# Altium footprint library ICL_connectors_v1.PcbLib: 86 footprints (part 2 of 6)
Each footprint in its own frame and in the unit in brackets; x right, y up, seen from the top. Pads: shape width x height; smd on the part's side, far side on the other; paste and mask are expansions set on the pad; w line width, h text height; cw(c..) or ccw(c..) is an arc to the next point about the centre after c.
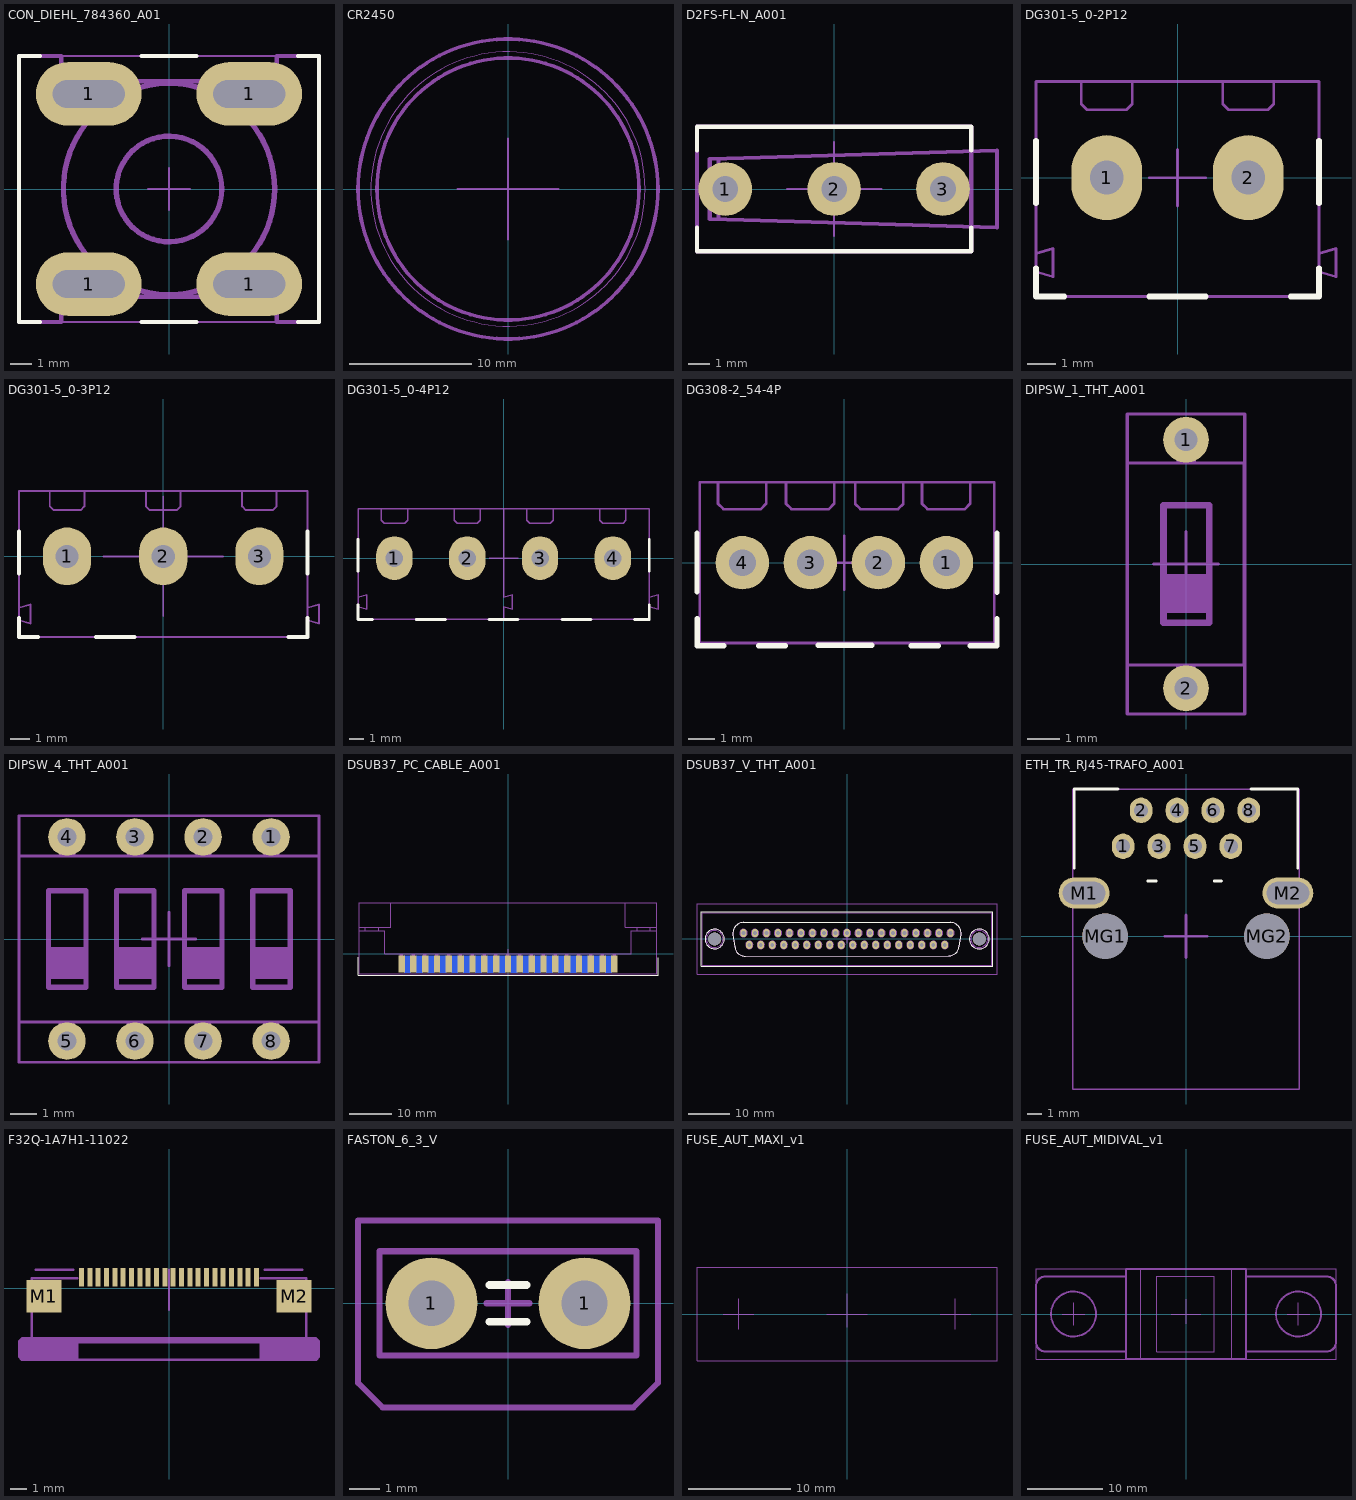
[diagram p1: the footprints below, top view; thin cyan lines are the x and y axes]

## CON_DIEHL_784360_A01 [mm] "Screw Mounting Bracket"
pads (4):
  oval 5x3 hole 1.3 slot 3.4 at 0 deg paste-1: 1(-3.8,-4.5) 1(-3.8,4.5) 1(3.8,-4.5) 1(3.8,4.5)
Top Overlay:
  lines w0.2: -6.1,-6.3 -7.1,-6.3 -7.1,6.3 -6.1,6.3 ; -1.3,-6.3 1.3,-6.3 ; -1.3,6.3 1.3,6.3 ; 6.1,-6.3 7.1,-6.3 7.1,6.3 6.1,6.3
Top M15-16_SORG:
  lines w0.1: -1,0 0,0 ; 0,-1 0,0 ; 0,1 0,0 ; 1,0 0,0 ; -7.1,-6.3 7.1,-6.3 7.1,6.3 -7.1,6.3 -7.1,-6.3
Top M17-18_TDES:
  text "'.Designator'" at -6.798,0.5 h1.2
Top M19-20_TMOT:
  circle w0.254: c0,0 r2.5
  circle w0.254: c0,0 r5
  lines w0.2: -7.1,-6.3 -7.1,6.3 -5.1,6.3 -5.1,5.1 ccw(c-4.05,5.1) -3,5.1 3,5.1 ccw(c4.05,5.1) 5.1,5.1 5.1,6.3 7.1,6.3 7.1,-6.3 5.1,-6.3 5.1,-5.1 ccw(c4.05,-5.1) 3,-5.1 -3,-5.1 ccw(c-4.05,-5.1) -5.1,-5.1 -5.1,-6.3 -7.1,-6.3
3D body "784360swp001.stp": height 16.9, standoff -3.7, extent -7.1,-6.3 7.1,6.3

## CR2450 [mm] "battery CR2450"
Top M15-16_SORG:
  lines w0.2: -4.1,0 0,0 ; 0,-4.1 0,0 ; 0,4.1 0,0 ; 4.1,0 0,0
Top M17-18_TDES:
  text "'.Designator'" at -10.297,5.15 h1.8
Top M19-20_TMOT:
  circle w0.1: c0,0 r11.2
  circle w0.3: c0,0 r12.25
  circle w0.3: c0,0 r10.7
3D body "CR_2450_panasonic.step": height 4.76, standoff 0.01, extent -12.25,-12.25 12.25,12.25

## D2FS-FL-N_A001 [mm] "omron D2FS-FL-Nxx"
pads (3):
  round 2.5 hole 1.2: 1(-5.08,0) 2(0,0) 3(5.08,0)
Top Overlay:
  lines w0.2: -6.4,-1.8 -6.4,-2.9 6.4,-2.9 6.4,-1.8 ; -6.4,1.8 -6.4,2.9 6.4,2.9 6.4,1.8
Top M15-16_SORG:
  lines w0.1: -2.2,0 0,0 ; 0,-2.2 0,0 ; 0,2.2 0,0 ; 2.2,0 0,0 ; 6.4,-1.8 7.6,-1.8 7.6,1.8 6.4,1.8 ; -6.4,-2.9 -6.4,2.9 6.4,2.9 6.4,-2.9 -6.4,-2.9
Top M17-18_TDES:
  text "'.Designator'" at -6.898,3.8 h1.2
Top M19-20_TMOT:
  lines w0.2: -6.4,1.8 -6.4,-2.9 ; -5.4,-1.4 -5.4,1.4 ; -6.4,-2.9 6.4,-2.9 6.4,2.9 -6.4,2.9 -6.4,-2.9 ; -5.8,-1.4 7.6,-1.8 7.6,1.8 -5.8,1.4 -5.8,-1.4
3D body "D2FS_FL_N.STEP": height 8.3, standoff -3.49, extent -6.4,-2.9 7.57,2.9

## DG301-5_0-2P12 [mm]
pads (2):
  oval 2.5x3 hole 1.2 paste-1: 1(-2.5,0) 2(2.5,0)
Top Overlay:
  lines w0.2: -5,-3.2 -5,-4.2 -4,-4.2 ; -5,-0.9 -5,1.3 ; -1,-4.2 0,-4.2 1,-4.2 ; 4,-4.2 5,-4.2 5,-3.2 ; 5,-0.9 5,1.3
Top M15-16_SORG:
  lines w0.1: -1,0 0,0 ; 0,-1 0,0 ; 0,1 0,0 ; 1,0 0,0 ; -5,-4.2 5,-4.2 5,3.4 -5,3.4 -5,-4.2
Top M17-18_TDES:
  text "'.Designator'" at -6.798,-3 h1.2
Top M19-20_TMOT:
  lines w0.1: -3.4,3.4 -3.4,2.6 -3.2,2.4 -1.8,2.4 -1.6,2.6 -1.6,3.4 ; 1.6,3.4 1.6,2.6 1.8,2.4 3.2,2.4 3.4,2.6 3.4,3.4 ; -5,-4.2 5,-4.2 5,-3.325 5.6,-3.5 5.6,-2.5 5,-2.675 5,3.4 -5,3.4 -5,-2.675 -4.4,-2.5 -4.4,-3.5 -5,-3.325 -5,-4.2
3D body "DG301-5_0-2P12.STEP": height 10, standoff -4.16, extent -5,-4.2 5.6,3.4

## DG301-5_0-3P12 [mm]
pads (3):
  oval 2.5x3 hole 1.2 paste-1: 1(-5,0) 2(0,0) 3(5,0)
Top Overlay:
  lines w0.2: -7.5,-3.2 -7.5,-4.2 -6.5,-4.2 ; -7.5,-0.9 -7.5,1.3 ; -3.5,-4.2 -2.5,-4.2 -1.5,-4.2 ; 6.5,-4.2 7.5,-4.2 7.5,-3.2 ; 7.5,-0.9 7.5,1.3
Top M15-16_SORG:
  lines w0.1: -3.1,0 0,0 ; 0,-3.1 0,0 ; 0,3.1 0,0 ; 3.1,0 0,0 ; -7.5,-4.2 -7.5,3.4 7.5,3.4 7.5,-4.2 -7.5,-4.2
Top M17-18_TDES:
  text "'.Designator'" at -6.798,-3.2 h1.2
Top M19-20_TMOT:
  lines w0.1: -5.9,3.4 -5.9,2.6 -5.7,2.4 -4.3,2.4 -4.1,2.6 -4.1,3.4 ; -0.9,3.4 -0.9,2.6 -0.7,2.4 0.7,2.4 0.9,2.6 0.9,3.4 ; 4.1,3.4 4.1,2.6 4.3,2.4 5.7,2.4 5.9,2.6 5.9,3.4 ; -7.5,-4.2 -7.5,-3.325 -6.9,-3.5 -6.9,-2.5 -7.5,-2.675 -7.5,3.4 7.5,3.4 7.5,-2.675 8.1,-2.5 8.1,-3.5 7.5,-3.325 7.5,-4.2 -7.5,-4.2
3D body "DG301-5_0-3P12.STEP": height 10.01, standoff -4.15, extent -7.5,-4.2 8.1,3.4

## DG301-5_0-4P12 [mm]
pads (4):
  oval 2.5x3 hole 1.2 paste-1: 1(-7.5,0) 2(-2.5,0) 3(2.5,0) 4(7.5,0)
Top Overlay:
  lines w0.2: -10,-3.2 -10,-4.2 -9,-4.2 ; -10,-0.9 -10,1.3 ; -6,-4.2 -5,-4.2 -4,-4.2 ; -1,-4.2 0,-4.2 1,-4.2 ; 4,-4.2 5,-4.2 6,-4.2 ; 9,-4.2 10,-4.2 10,-3.2 ; 10,-0.9 10,1.3
Top M15-16_SORG:
  lines w0.1: -1,0 0,0 ; 0,-1 0,0 ; 0,1 0,0 ; 1,0 0,0 ; -10,-4.2 -10,3.4 10,3.4 10,-4.2 -10,-4.2
Top M17-18_TDES:
  text "'.Designator'" at -6.798,-3 h1.2
Top M19-20_TMOT:
  lines w0.1: -8.4,3.4 -8.4,2.6 -8.2,2.4 -6.8,2.4 -6.6,2.6 -6.6,3.4 ; -3.4,3.4 -3.4,2.6 -3.2,2.4 -1.8,2.4 -1.6,2.6 -1.6,3.4 ; 1.6,3.4 1.6,2.6 1.8,2.4 3.2,2.4 3.4,2.6 3.4,3.4 ; 6.6,3.4 6.6,2.6 6.8,2.4 8.2,2.4 8.4,2.6 8.4,3.4 ; 0,-4.2 -10,-4.2 -10,-3.325 -9.4,-3.5 -9.4,-2.5 -10,-2.675 -10,3.4 0,3.4 ; 0,-4.2 0,-3.325 0.6,-3.5 0.6,-2.5 0,-2.675 0,3.4 ; 0,-4.2 10,-4.2 10,-3.325 10.6,-3.5 10.6,-2.5 10,-2.675 10,3.4 0,3.4
3D body "DG301-5_0-2P12.STEP": height 10, standoff -4.16, extent 0,-4.2 10.6,3.4
3D body "DG301-5_0-2P12.STEP": height 10, standoff -4.16, extent -10,-4.2 0.6,3.4

## DG308-2_54-4P [mm]
pads (4):
  round 2 hole 1 paste-1: 1(3.81,0) 2(1.27,0) 3(-1.27,0) 4(-3.81,0)
Top Overlay:
  lines w0.2: -5.504,-1.091 -5.504,1.109 ; -5.5,-2.1 -5.5,-3.1 -4.5,-3.1 ; -3.2,-3.1 -2.2,-3.1 ; -0.982,-3.08 0.018,-3.08 ; 0.018,-3.08 1.018,-3.08 ; 2.5,-3.1 3.5,-3.1 ; 4.7,-3.1 5.7,-3.1 5.7,-2.1 ; 5.7,-1.1 5.7,1.1
Top M15-16_SORG:
  lines w0.1: -1,0 0,0 ; 0,-1 0,0 ; 0,1 0,0 ; 1,0 0,0 ; -5.4,-3 5.6,-3 5.6,3 -5.4,3 -5.4,-3
Top M17-18_TDES:
  text "'.Designator'" at -6.798,-2.7 h1.2
Top M19-20_TMOT:
  lines w0.1: -4.72,3 -4.72,2.2 -4.52,2 -3.12,2 -2.92,2.2 -2.92,3 ; -2.18,3 -2.18,2.2 -1.98,2 -0.58,2 -0.38,2.2 -0.38,3 ; 2.2,3 2.2,2.2 2,2 0.6,2 0.4,2.2 0.4,3 ; 2.9,3 2.9,2.2 3.1,2 4.5,2 4.7,2.2 4.7,3 ; 0.4,3 5.6,3 5.6,-3 -5.4,-3 -5.4,3 0.4,3
3D body "DG308-4.step": height 7.84, standoff -3.99, extent -5.43,-3.022 5.57,3

## DIPSW_1_THT_A001 [mm]
pads (2):
  round 1.4 hole 0.7 mask+0: 1(0,3.81) 2(0,-3.81)
Top M15-16_SORG:
  lines w0.1: -1,0 0,0 ; 0,-1 0,0 ; 0,1 0,0 ; 1,0 0,0 ; -1.8,-4.6 -1.8,4.6 1.8,4.6 1.8,-4.6 -1.8,-4.6
Top M17-18_TDES:
  text "'.Designator'" at -6.598,5.2 h1.2
Top M19-20_TMOT:
  rectangle: -0.69,-1.5 0.71,-0.3
  region: 0.29,-3.1 -0.31,-3.1 -0.31,-4 0.29,-4
  rectangle: -0.29,3.1 0.31,4
  lines w0.1: -1.8,-3.1 -1.8,3.1 1.79,3.1 1.79,-3.1 -1.8,-3.1
  lines w0.2: -0.69,-1.8 -0.69,1.8 0.71,1.8 0.71,-1.8 -0.69,-1.8
  text "1" at -0.123,-2.9 h0.8
  text "ON" at -1.566,2.1 h0.8
3D body "a6t-1104.stp": height 5.7, standoff -2, extent -1.74,-5.252 1.74,5.252

## DIPSW_4_THT_A001 [mm]
pads (8):
  round 1.4 hole 0.7 mask+0: 1(3.81,3.81) 2(1.27,3.81) 3(-1.27,3.81) 4(-3.81,3.81) 5(-3.81,-3.81) 6(-1.27,-3.81) 7(1.27,-3.81) 8(3.81,-3.81)
Top M15-16_SORG:
  lines w0.1: -1,0 0,0 ; 0,-1 0,0 ; 0,1 0,0 ; 1,0 0,0 ; -5.6,-4.6 5.6,-4.6 5.6,4.6 -5.6,4.6 -5.6,-4.6
Top M17-18_TDES:
  text "'.Designator'" at -6.598,5.2 h1.2
Top M19-20_TMOT:
  rectangle: -4.1,3.1 -3.5,4
  rectangle: -1.56,3.1 -0.96,4
  rectangle: 0.98,3.1 1.58,4
  rectangle: 3.52,3.1 4.12,4
  region: -3.52,-3.1 -4.12,-3.1 -4.12,-4 -3.52,-4
  region: -0.98,-3.1 -1.58,-3.1 -1.58,-4 -0.98,-4
  region: 1.56,-3.1 0.96,-3.1 0.96,-4 1.56,-4
  region: 4.1,-3.1 3.5,-3.1 3.5,-4 4.1,-4
  rectangle: -4.5,-1.5 -3.1,-0.3
  rectangle: -1.96,-1.5 -0.56,-0.3
  rectangle: 0.58,-1.5 1.98,-0.3
  rectangle: 3.12,-1.5 4.52,-0.3
  lines w0.1: -5.6,-3.1 5.6,-3.1 5.6,3.1 -5.6,3.1 -5.6,-3.1
  lines w0.2: -4.5,-1.8 -3.1,-1.8 -3.1,1.8 -4.5,1.8 -4.5,-1.8 ; -1.96,-1.8 -0.56,-1.8 -0.56,1.8 -1.96,1.8 -1.96,-1.8 ; 0.58,-1.8 1.98,-1.8 1.98,1.8 0.58,1.8 0.58,-1.8 ; 3.12,-1.8 4.52,-1.8 4.52,1.8 3.12,1.8 3.12,-1.8
  text "1" at -3.933,-2.9 h0.8
  text "ON" at -5.366,2.1 h0.8
  text "2" at -1.527,-2.9 h0.8
  text "3" at 1.013,-2.9 h0.8
  text "4" at 3.553,-2.9 h0.8
3D body "a6d-4100.stp": height 6, standoff -2, extent -6.1,-4.103 6.1,4.104

## DSUB37_PC_CABLE_A001 [mm] "Amphenoll L77SDC37S"
pads (37):
  rect 1.5x4 smd paste-1: 1(-24.84,-2.45) 2(-22.08,-2.45) 3(-19.32,-2.45) 4(-16.56,-2.45) 5(-13.8,-2.45) 6(-11.04,-2.45) 7(-8.28,-2.45) 8(-5.52,-2.45) 9(-2.76,-2.45) 10(0,-2.45) 11(2.76,-2.45) 12(5.52,-2.45) 13(8.28,-2.45) 14(11.04,-2.45) 15(13.8,-2.45) 16(16.56,-2.45) 17(19.32,-2.45) 18(22.08,-2.45) 19(24.84,-2.45)
  rect 1.5x4 smd far side paste-1: 20(-23.46,-2.45) 21(-20.7,-2.45) 22(-17.94,-2.45) 23(-15.18,-2.45) 24(-12.42,-2.45) 25(-9.66,-2.45) 26(-6.9,-2.45) 27(-4.14,-2.45) 28(-1.38,-2.45) 29(1.38,-2.45) 30(4.14,-2.45) 31(6.9,-2.45) 32(9.66,-2.45) 33(12.42,-2.45) 34(15.18,-2.45) 35(17.94,-2.45) 36(20.7,-2.45) 37(23.46,-2.45)
Top Overlay:
  lines w0.2: -35,-0.9 -35,-5.1 -19.1,-5.1 35,-5.1 35,-1
Top M17-18_TDES:
  text "'.Designator'" at -11.73,4.067 h2
Top M19-20_TMOT:
  rectangle: -25.3,-3.4 -24.5,0
  rectangle: -22.54,-3.4 -21.74,0
  rectangle: -19.78,-3.4 -18.98,0
  rectangle: -17.02,-3.4 -16.22,0
  rectangle: -14.26,-3.4 -13.46,0
  rectangle: -11.5,-3.4 -10.7,0
  rectangle: -8.74,-3.4 -7.94,0
  rectangle: -5.98,-3.4 -5.18,0
  rectangle: -3.22,-3.4 -2.42,0
  rectangle: -0.46,-3.4 0.34,0
  rectangle: 2.3,-3.4 3.1,0
  rectangle: 5.06,-3.4 5.86,0
  rectangle: 7.82,-3.4 8.62,0
  rectangle: 10.58,-3.4 11.38,0
  rectangle: 13.34,-3.4 14.14,0
  rectangle: 16.1,-3.4 16.9,0
  rectangle: 18.86,-3.4 19.66,0
  rectangle: 21.62,-3.4 22.42,0
  rectangle: 24.38,-3.4 25.18,0
  lines w0.15: -28.7,5.3 -28.7,0 28.7,0 28.7,5.3 ; -27.4,11.9 27.4,11.9
  lines w0.2: -33.3,5.3 -33.3,6.1 ; -30.2,5.3 -30.2,6.1 ; -28.7,5.3 -34.7,5.3 -34.7,6.1 -27.4,6.1 -27.4,11.9 ; 27.4,11.9 27.4,6.1 34.7,6.1 34.7,5.3 28.7,5.3 ; 30.2,5.3 30.2,6.1 ; 33.2,5.3 33.2,6.1
Top M25-26_TORG:
  lines w0.1: -1,0 1,0 ; 0,-1 0,1 ; -34.7,-4.7 -34.7,11.9 34.7,11.9 34.7,-4.7 -34.7,-4.7
3D body "L77SDC37S_L177SDC37S_L77SDC37SC309.stp": height 6.27, standoff -6.27, extent -34.7,-3.1 34.7,11.9

## DSUB37_V_THT_A001 [mm] "Amphenoll LD37S24A4GV00LF"
pads (39):
  oval 1.5x2 hole 0.9 paste-1: 1(24.84,1.42) 2(22.08,1.42) 3(19.32,1.42) 4(16.56,1.42) 5(13.8,1.42) 6(11.04,1.42) 7(8.28,1.42) 8(5.52,1.42) 9(2.76,1.42) 10(0,1.42) 11(-2.76,1.42) 12(-5.52,1.42) 13(-8.28,1.42) 14(-11.04,1.42) 15(-13.8,1.42) 16(-16.56,1.42) 17(-19.32,1.42) 18(-22.08,1.42) 19(-24.84,1.42) 20(23.46,-1.42) 21(20.7,-1.42) 22(17.94,-1.42) 23(15.18,-1.42) 24(12.42,-1.42) 25(9.66,-1.42) 26(6.9,-1.42) 27(4.14,-1.42) 28(1.38,-1.42) 29(-1.38,-1.42) 30(-4.14,-1.42) 31(-6.9,-1.42) 32(-9.66,-1.42) 33(-12.42,-1.42) 34(-15.18,-1.42) 35(-17.94,-1.42) 36(-20.7,-1.42) 37(-23.46,-1.42)
  round 3.1 hole 3.1 unplated: MH1(-31.75,0) MH2(31.75,0)
Top Overlay:
  circle w0.254: c31.75,0 r2.396
  circle w0.254: c-31.75,0 r2.331
  lines w0.2: -35,-6.5 -35,6.5 35,6.5 35,-6.5 -20.5,-6.5 -35,-6.5 ; -27.4,1 cw(c-24.65,1.25) -24.9,4 24.9,4 cw(c24.65,1.25) 27.4,1 26.9,-1.8 cw(c24.55,-1.65) 24.4,-4 -24.402,-4.083 cw(c-24.56,-1.742) -26.9,-1.9 -27.4,1
Top M17-18_TDES:
  text "'.Designator'" at -11.73,4.067 h2
Top M19-20_TMOT:
  circle w0.05: c8.28,1.42 r0.7
  circle w0.05: c-9.66,-1.42 r0.7
  circle w0.05: c-12.42,-1.42 r0.7
  circle w0.05: c-15.18,-1.42 r0.7
  circle w0.05: c-17.94,-1.42 r0.7
  circle w0.05: c-20.7,-1.42 r0.7
  circle w0.05: c-23.46,-1.42 r0.7
  circle w0.05: c6.9,-1.42 r0.7
  circle w0.05: c4.14,-1.42 r0.7
  circle w0.05: c1.38,-1.42 r0.7
  circle w0.05: c-1.38,-1.42 r0.7
  circle w0.05: c-4.14,-1.42 r0.7
  circle w0.05: c-6.9,-1.42 r0.7
  circle w0.05: c23.46,-1.42 r0.7
  circle w0.05: c20.7,-1.42 r0.7
  circle w0.05: c17.94,-1.42 r0.7
  circle w0.05: c15.18,-1.42 r0.7
  circle w0.05: c12.42,-1.42 r0.7
  circle w0.05: c9.66,-1.42 r0.7
  circle w0.05: c24.84,1.42 r0.7
  circle w0.05: c22.08,1.42 r0.7
  circle w0.05: c19.32,1.42 r0.7
  circle w0.05: c16.56,1.42 r0.7
  circle w0.05: c13.8,1.42 r0.7
  circle w0.05: c11.04,1.42 r0.7
  circle w0.05: c5.52,1.42 r0.7
  circle w0.05: c2.76,1.42 r0.7
  circle w0.05: c0,1.42 r0.7
  circle w0.05: c-2.76,1.42 r0.7
  circle w0.05: c-5.52,1.42 r0.7
  circle w0.05: c-8.28,1.42 r0.7
  circle w0.05: c-11.04,1.42 r0.7
  circle w0.05: c-13.8,1.42 r0.7
  circle w0.05: c-16.56,1.42 r0.7
  circle w0.05: c-19.32,1.42 r0.7
  circle w0.05: c-19.32,1.42 r0.7
  circle w0.05: c-22.08,1.42 r0.7
  circle w0.15: c-24.84,1.42 r0.9
  circle w0.2: c-31.75,0 r2.3
  circle w0.1: c-31.75,0 r2
  circle w0.2: c31.75,0 r2.3
  circle w0.1: c31.75,0 r2
  circle w0.05: c-24.84,1.42 r0.7
  circle w0.15: c-22.08,1.42 r0.9
  circle w0.15: c-19.32,1.42 r0.9
  circle w0.15: c-16.56,1.42 r0.9
  circle w0.15: c-13.8,1.42 r0.9
  circle w0.15: c-11.04,1.42 r0.9
  circle w0.15: c-8.28,1.42 r0.9
  circle w0.15: c-5.52,1.42 r0.9
  circle w0.15: c-2.76,1.42 r0.9
  circle w0.15: c0,1.42 r0.9
  circle w0.15: c2.76,1.42 r0.9
  circle w0.15: c5.52,1.42 r0.9
  circle w0.15: c8.28,1.42 r0.9
  circle w0.15: c11.04,1.42 r0.9
  circle w0.15: c13.8,1.42 r0.9
  circle w0.15: c16.56,1.42 r0.9
  circle w0.15: c19.32,1.42 r0.9
  circle w0.15: c22.08,1.42 r0.9
  circle w0.15: c24.84,1.42 r0.9
  circle w0.15: c15.18,-1.42 r0.9
  circle w0.15: c17.94,-1.42 r0.9
  circle w0.15: c20.7,-1.42 r0.9
  circle w0.15: c23.46,-1.42 r0.9
  circle w0.15: c4.14,-1.42 r0.9
  circle w0.15: c6.9,-1.42 r0.9
  circle w0.15: c9.66,-1.42 r0.9
  circle w0.15: c12.42,-1.42 r0.9
  circle w0.15: c-6.9,-1.42 r0.9
  circle w0.15: c-4.14,-1.42 r0.9
  circle w0.15: c-1.38,-1.42 r0.9
  circle w0.15: c1.38,-1.42 r0.9
  circle w0.15: c-17.94,-1.42 r0.9
  circle w0.15: c-15.18,-1.42 r0.9
  circle w0.15: c-12.42,-1.42 r0.9
  circle w0.15: c-9.66,-1.42 r0.9
  circle w0.15: c-23.46,-1.42 r0.9
  circle w0.15: c-20.7,-1.42 r0.9
  lines w0.15: -34.8,-6.3 -34.8,6.3 34.8,6.3 34.8,-6.3 -34.8,-6.3
  lines w0.2: -27.4,1 cw(c-24.65,1.25) -24.9,4 24.9,4 cw(c24.65,1.25) 27.4,1 26.9,-1.8 cw(c24.55,-1.65) 24.4,-4 -24.402,-4.083 cw(c-24.56,-1.742) -26.9,-1.9 -27.4,1
Top M25-26_TORG:
  lines w0.1: -1,0 1,0 ; 0,-1 0,1 ; -36,-8.5 -36,8.5 36,8.5 36,-8.5 -36,-8.5
3D body "sld37s24a4gv00lf_color.stp": height 12.26, standoff -2.94, extent -34.75,-6.275 34.75,6.275

## ETH_TR_RJ45-TRAFO_A001 [mm] "Ethernet gniazdo 100Tx"
pads (12):
  oval 1.6x1.8 hole 1: 1(-4.445,6.35) 2(-3.175,8.89) 3(-1.905,6.35) 4(-0.633,8.89) 5(0.635,6.35) 6(1.905,8.89) 7(3.175,6.35) 8(4.445,8.89)
  oval 3.6x2.2 hole 1.6 slot 3 at 0 deg: M1(-7.2,3.05) M2(7.2,3.05)
  round 3.2 hole 3.2 unplated: MG1(-5.715,0) MG2(5.715,0)
Top Overlay:
  lines w0.2: -7.9,4.8 -7.9,10.4 -4.8,10.4 ; -2.7,3.9 -2.1,3.9 ; 2,3.9 2.5,3.9 ; 4.6,10.4 7.9,10.4 7.9,4.8
Top M15-16_SORG:
  lines w0.2: -1.5,0 0,0 ; 0,-1.5 0,0 ; 0,1.5 0,0 ; 1.5,0 0,0
Top M17-18_TDES:
  text "'.Designator'" at -5.565,-2.817 h1
Top M19-20_TMOT:
  lines w0.1: -8,-10.8 -8,10.4 8,10.4 8,-10.8 -8,-10.8
3D body "ACC-M-FRJAE-488-REVT1.step": height 14.16, standoff -3.67, extent -7.695,-8.131 7.695,10.538

## F32Q-1A7H1-11022 [mm] "FPC top 22pin e - 0,5mm"
pads (24):
  rect 0.3x1.1 smd: 1(-5.25,0.65) 2(-4.75,0.65) 3(-4.25,0.65) 4(-3.75,0.65) 5(-3.25,0.65) 6(-2.75,0.65) 7(-2.25,0.65) 8(-1.75,0.65) 9(-1.25,0.65) 10(-0.75,0.65) 11(-0.25,0.65) 12(0.25,0.65) 13(0.75,0.65) 14(1.25,0.65) 15(1.75,0.65) 16(2.25,0.65) 17(2.75,0.65) 18(3.25,0.65) 19(3.75,0.65) 20(4.25,0.65) 21(4.75,0.65) 22(5.25,0.65)
  rect 2.1x1.95 smd: M1(-7.5,-0.475) M2(7.5,-0.475)
Top M11-12_SMOT:
  rectangle: -5.368,0.258 -5.145,1.075
  rectangle: -4.868,0.258 -4.645,1.075
  rectangle: -4.368,0.258 -4.145,1.075
  rectangle: -3.868,0.258 -3.645,1.075
  rectangle: -3.368,0.258 -3.145,1.075
  rectangle: -2.868,0.258 -2.645,1.075
  rectangle: -2.368,0.258 -2.145,1.075
  rectangle: -1.868,0.258 -1.645,1.075
  rectangle: -1.368,0.258 -1.145,1.075
  rectangle: -0.868,0.258 -0.645,1.075
  rectangle: -0.368,0.258 -0.145,1.075
  rectangle: 0.132,0.258 0.355,1.075
  rectangle: 0.632,0.258 0.855,1.075
  rectangle: 1.132,0.258 1.355,1.075
  rectangle: 1.632,0.258 1.855,1.075
  rectangle: 2.132,0.258 2.355,1.075
  rectangle: 2.632,0.258 2.855,1.075
  rectangle: 3.132,0.258 3.355,1.075
  rectangle: 3.632,0.258 3.855,1.075
  rectangle: 4.132,0.258 4.355,1.075
  rectangle: 4.632,0.258 4.855,1.075
  rectangle: 5.132,0.258 5.355,1.075
  region: -5.5,-3 -8.8,-3 -9,-3.2 -9,-4.116 -8.816,-4.3 -5.5,-4.3
  region: 5.5,-3 8.8,-3 9,-3.2 9,-4.116 8.816,-4.3 5.5,-4.3
  region: -5.5,-3.3 5.5,-3.3 5.5,-3 -5.5,-3
  lines w0.15: -5.5,-3 -5.5,-4.3 ; -5.5,0.6 -8.25,0.6 -8.25,-3 ; 5.5,-3 5.5,-4.3 ; 5.5,0.6 8.25,0.6 8.25,-3 ; -8.25,-3 0,-3 8.25,-3 ; -8.25,-3 -8.8,-3 -9,-3.2 -9,-4.116 -8.816,-4.3 -5.5,-4.3 ; -5.5,-4.3 5.5,-4.3 ; 5.5,-4.3 8.816,-4.3 9,-4.116 9,-3.2 8.8,-3 8.25,-3
Top M13-14_SDES:
  text "'.Designator'" at -5.665,2.083 h1
Top M15-16_SORG:
  lines w0.15: -8,1.1 -5.75,1.1 ; 0,-1.3 0,1.1 ; 5.75,1.1 8,1.1
3D body "f32q_22pin_asm_color.STEP": height 2.01, standoff -0.04, extent -9.15,-4.4 9.15,1.1

## FASTON_6_3_V [mm] "Faston 6,3mm pionowy ,sam bez wsowki"
pads (2):
  round 3 hole 1.5: 1(-2.5,0) 1(2.5,0)
Top Overlay:
  lines w0.254: -0.6,-0.6 0.6,-0.6 ; -0.6,0.6 0.6,0.6
Top M15-16_SORG:
  lines w0.2: -0.7,0 0.7,0 ; 0,-0.7 0,0.7 ; -4.2,-1.7 4.2,-1.7 4.2,1.7 -4.2,1.7 -4.2,-1.7
Top M19-20_TMOT:
  lines w0.2: -4.9,-2.6 -4.9,2.7 4.9,2.7 4.9,-2.6 4.1,-3.4 -4.1,-3.4 -4.9,-2.6
3D body "FASTON_ 6_3x0_8x14.step": height 10.01, standoff -3.99, extent -4,-0.4 4,0.4

## FUSE_AUT_MAXI_v1 [mm] "maxi fuse automotive"
Top M15-16_SORG:
  lines w0.1: -12.13,0 -10.63,0 ; -10.63,-1.5 -10.63,0 ; -10.63,1.5 -10.63,0 ; -9.13,0 -10.63,0 ; -2,0 0,0 ; 0,-1.3 0,0 ; 0,2 0,0 ; 2,0 0,0 ; 9.13,0 10.63,0 ; 10.63,-1.5 10.63,0 ; 10.63,1.5 10.63,0 ; 12.13,0 10.63,0 ; -14.7,-4.6 -14.7,4.6 14.7,4.6 14.7,-4.6 -14.7,-4.6
Top M17-18_TDES:
  text "'.Designator'" at -6.165,3.283 h1
3D body "User Library-Bussmann MAXI.step": height 34.89, standoff 0.01, extent -14.694,-4.623 14.694,4.623

## FUSE_AUT_MIDIVAL_v1 [mm] "MIDIVAL  fuse automotive"
Top M15-16_SORG:
  circle w0.254: c15,0 r3
  circle w0.254: c-15,0 r3
  lines w0.1: -16.5,0 -15,0 ; -15,-1.5 -15,0 ; -15,1.5 -15,0 ; -13.5,0 -15,0 ; -2,0 0,0 ; 0,-1.3 0,0 ; 0,2 0,0 ; 2,0 0,0 ; 13.5,0 15,0 ; 15,-1.5 15,0 ; 15,1.5 15,0 ; 16.5,0 15,0 ; -20,-6 20,-6 20,6 -20,6 -20,-6
Top M17-18_TDES:
  text "'.Designator'" at -6.065,6.883 h1
Top M19-20_TMOT:
  lines w0.1: -6,-6 -6,6 ; 6.1,-6 6.1,6 ; -3.891,-5 3.776,-5 3.776,5 -3.891,5 -3.891,-5
  lines w0.3: -8,-5 -18.73,-5 cw(c-18.73,-3.73) -20,-3.73 -20,3.73 cw(c-18.73,3.73) -18.73,5 -8,5 ; -8,-5 -8,5 ; -8,-5 -8,-6 8,-6 8,-5 ; -8,5 -8,6 8,6 8,5 ; 8,-5 18.73,-5 ccw(c18.73,-3.73) 20,-3.73 20,3.73 ccw(c18.73,3.73) 18.73,5 8,5 ; 8,-5 8,5
3D body "Fuse_MidiVal_v1.stp": height 9.1, standoff 0.9, extent -20,-6 20,6